# Altium footprint library BRT_Components.PcbLib: 132 footprints (part 1 of 9)
Each footprint in its own frame and in the unit in brackets; x right, y up, seen from the top. Pads: shape width x height; smd on the part's side, far side on the other; paste and mask are expansions set on the pad; w line width, h text height; cw(c..) or ccw(c..) is an arc to the next point about the centre after c.
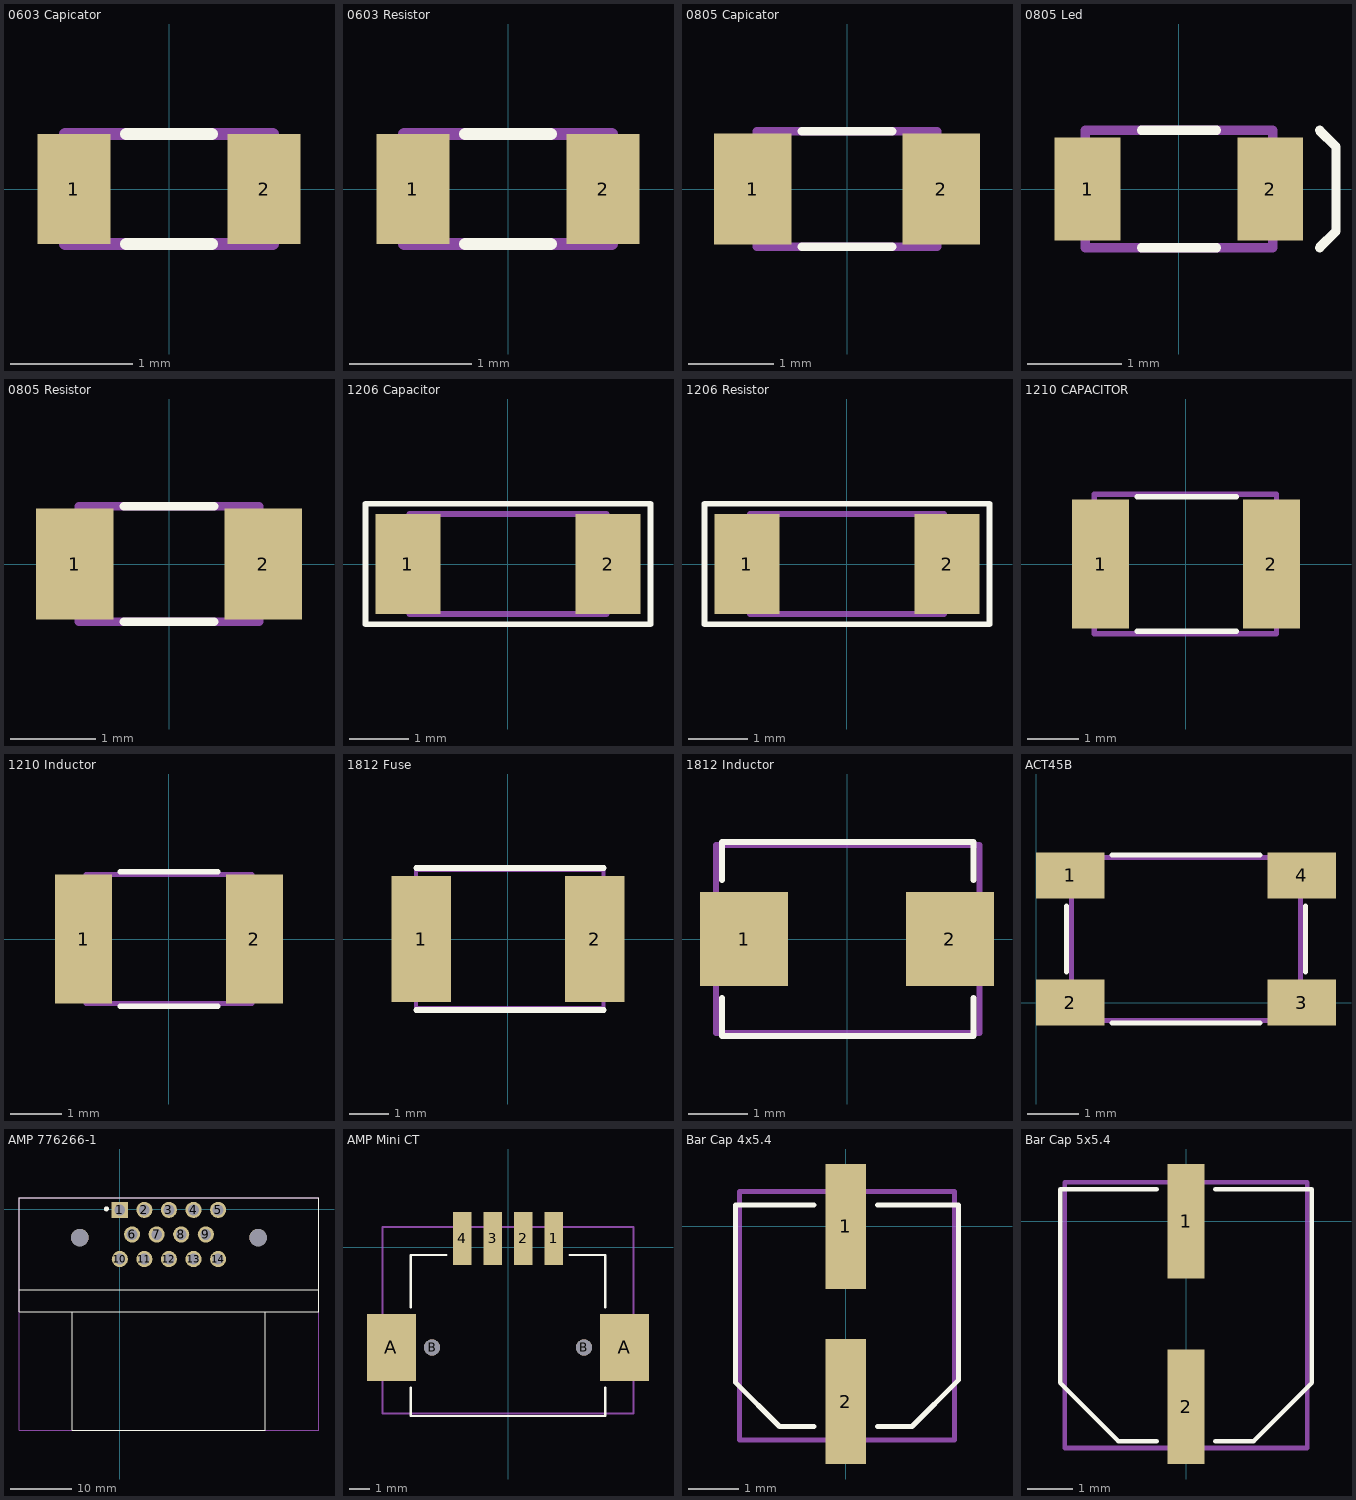
[diagram p0: the footprints below, top view; thin cyan lines are the x and y axes]

## 0603 Capicator [mm]
pads (2):
  rect 0.6x0.9 smd: 1(-0.78,0) 2(0.78,0)
Top Overlay:
  lines w0.1: -0.35,-0.45 0.35,-0.45 ; -0.35,0.45 0.35,0.45
Mechanical 13:
  lines w0.1: -0.85,-0.45 -0.85,0.45 0.85,0.45 0.85,-0.45 -0.85,-0.45
3D body "CAPC-0603-T0.9-BN.stp": height 0.9, standoff 0, extent -0.825,-0.45 0.875,0.45

## 0603 Resistor [mm]
pads (2):
  rect 0.6x0.9 smd: 1(-0.78,0) 2(0.78,0)
Top Overlay:
  lines w0.1: -0.35,-0.45 0.35,-0.45 ; -0.35,0.45 0.35,0.45
Mechanical 13:
  lines w0.1: -0.85,-0.45 0.85,-0.45 0.85,0.45 -0.85,0.45 -0.85,-0.45
3D body "RESC-0603.stp": height 0.55, standoff 0, extent -0.85,-0.45 0.85,0.45

## 0805 Capicator [mm]
pads (2):
  rect 0.9x1.3 smd: 1(-1.1,0) 2(1.1,0)
Top Overlay:
  lines w0.1: -0.525,-0.675 0.525,-0.675 ; -0.525,0.675 0.525,0.675
Mechanical 13:
  lines w0.1: -1.05,-0.675 1.05,-0.675 1.05,0.675 -1.05,0.675 -1.05,-0.675
3D body "CAPC-0805-T0.75-BN.stp": height 0.75, standoff 0, extent -1.05,-0.675 1.05,0.675

## 0805 Led [mm]
pads (2):
  rect 0.7x1.1 smd: 1(-0.975,0) 2(0.975,0)
Top Overlay:
  lines w0.1: -0.4,-0.625 0.4,-0.625 ; -0.4,0.625 0.4,0.625 ; 1.5,-0.625 1.675,-0.45 1.675,0.45 1.5,0.625
Mechanical 13:
  lines w0.1: -1,-0.625 -1,0.625 1,0.625 1,-0.625 -1,-0.625
3D body "LED0805.step": height 1.1, standoff 0, extent -1.01,-0.625 1.01,0.625

## 0805 Resistor [mm]
pads (2):
  rect 0.9x1.3 smd: 1(-1.1,0) 2(1.1,0)
Top Overlay:
  lines w0.1: -0.525,-0.675 0.525,-0.675 ; -0.525,0.675 0.525,0.675
Mechanical 13:
  lines w0.1: -1.05,-0.675 1.05,-0.675 1.05,0.675 -1.05,0.675 -1.05,-0.675
3D body "RESC-0805.stp": height 0.6, standoff 0, extent -1.05,-0.675 1.05,0.675

## 1206 Capacitor [mm]
pads (2):
  rect 1.1x1.7 smd: 1(-1.7,0) 2(1.7,0)
Top Overlay:
  lines w0.1: -2.425,-1.025 -2.425,0.175 -2.425,1.025 2.425,1.025 2.425,-1.025 -2.425,-1.025
Mechanical 13:
  lines w0.1: -1.675,-0.85 1.675,-0.85 1.675,0.85 -1.675,0.85 -1.675,-0.85
3D body "CAPC-1206-T1.0-BN.stp": height 1, standoff 0, extent -1.675,-0.875 1.675,0.875

## 1206 Resistor [mm]
pads (2):
  rect 1.1x1.7 smd: 1(-1.7,0) 2(1.7,0)
Top Overlay:
  lines w0.1: -2.425,-1.025 -2.425,0.175 -2.425,1.025 2.425,1.025 2.425,-1.025 -2.425,-1.025
Mechanical 13:
  lines w0.1: -1.65,-0.85 1.65,-0.85 1.65,0.85 -1.65,0.85 -1.65,-0.85
3D body "RESC-1206.stp": height 0.65, standoff 0, extent -1.65,-0.85 1.65,0.85

## 1210 CAPACITOR [mm]
pads (2):
  rect 1.1x2.5 smd: 1(-1.65,0) 2(1.65,0)
Top Overlay:
  lines w0.1: -0.95,-1.3 0.975,-1.3 ; -0.95,1.3 0.975,1.3
Mechanical 13:
  lines w0.1: -1.775,-1.35 1.75,-1.35 1.75,1.35 -1.775,1.35 -1.775,-1.35
3D body "CAPC-1210-T1.8-BN.stp": height 1.8, standoff 0, extent -1.75,-1.35 1.75,1.35

## 1210 Inductor [mm]
pads (2):
  rect 1.1x2.5 smd: 1(-1.65,0) 2(1.65,0)
Top Overlay:
  lines w0.1: -0.95,-1.3 0.95,-1.3 ; -0.95,1.3 0.95,1.3
Mechanical 13:
  lines w0.1: -1.602,-1.25 -1.602,1.25 1.602,1.25 1.602,-1.25 -1.602,-1.25
3D body "User Library-NLV32.step": height 2.28, standoff 0, extent -1.602,-1.25 1.602,1.25

## 1812 Fuse [mm]
height 1.1
pads (2):
  rect 1.5x3.2 smd: 1(-2.2,0) 2(2.2,0)
Top Overlay:
  lines w0.15: -2.325,-1.8 2.425,-1.8 ; -2.325,1.8 2.425,1.8
Mechanical 13:
  lines w0.1: -2.325,-1.75 2.425,-1.75 2.425,1.75 -2.325,1.75 -2.325,-1.75
3D body "User Library-Fuse 1812.step": height 1.03, standoff 0, extent -2.32,-1.745 2.415,1.735

## 1812 Inductor [mm]
pads (2):
  rect 1.5x1.6 smd: 1(-1.75,0) 2(1.75,0)
Top Overlay:
  lines w0.1: -2.125,-1 -2.125,-1.65 1.95,-1.65 2.15,-1.65 2.15,-1 ; -2.125,1 -2.125,1.65 2.15,1.65 2.15,1
Mechanical 13:
  lines w0.1: -2.225,-1.6 -2.225,1.6 2.25,1.6 2.25,-1.6 -2.225,-1.6
3D body "cm453232.stp": height 3.3, standoff 0.1, extent -2.25,-1.6 2.25,1.6

## ACT45B [mm]
pads (4):
  rect 1.35x0.9 smd: 1(0.675,2.5) 2(0.675,0) 3(5.225,0) 4(5.225,2.5)
Top Overlay:
  lines w0.1: 0.6,0.6 0.6,1.9 ; 1.5,-0.4 4.4,-0.4 ; 1.5,2.9 4.4,2.9 ; 5.3,0.6 5.3,1.9
Mechanical 13:
  lines w0.1: 0.7,-0.35 5.2,-0.35 5.2,2.85 0.7,2.85 0.7,-0.35
3D body "ACT45B_GERMANY.STEP": height 3, standoff 0, extent 0.7,-0.35 5.2,2.85

## AMP 776266-1 [mm]
pads (16):
  rect 2.625x2.625 hole 1.75: 1(-0.019,-0.061)
  round 2.625 hole 1.75: 2(3.981,-0.061) 3(7.981,-0.061) 4(11.981,-0.061) 5(15.981,-0.061) 6(1.981,-4.061) 7(5.981,-4.061) 8(9.981,-4.061) 9(13.981,-4.061) 10(-0.019,-8.061) 11(3.981,-8.061) 12(7.981,-8.061) 13(11.981,-8.061) 14(15.981,-8.061)
  round 2.85 hole 2.85 unplated: None(-6.519,-4.561) None(22.481,-4.561)
Top Overlay:
  circle w0.4: c-2.2,0.1 r0.2
  lines w0.1: -16.419,-13.061 32.381,-13.061 ; -16.419,-13.061 -16.419,1.9 32.381,1.9 32.381,-13.061 ; -16.419,-13.061 -16.419,-16.611 -7.719,-16.611 ; -7.719,-16.611 23.681,-16.611 ; -7.719,-16.611 -7.719,-35.911 23.681,-35.911 23.681,-16.611 ; 23.681,-16.611 32.381,-16.611 32.381,-13.061
Mechanical 13:
  lines w0.1: -16.4,-35.9 -16.4,1.9 32.4,1.9 32.4,-35.9 -16.4,-35.9
3D body "AMP 776266-1.stp": height 29.05, standoff -3.05, extent -16.4,-35.9 32.4,1.9

## AMP Mini CT [mm]
pads (8):
  rect 0.914x2.6 smd: 1(2.25,0.433) 2(0.75,0.433) 3(-0.75,0.433) 4(-2.25,0.433)
  rect 2.413x3.302 smd: A(-5.753,-4.945) A(5.753,-4.945)
  round 0.8 hole 0.8: B(-3.75,-4.945) B(3.75,-4.945)
Top Overlay:
  lines w0.1: -4.8,-6.929 -4.8,-8.323 4.8,-8.323 4.8,-6.929 ; -4.8,-2.961 -4.8,-0.373 -3.04,-0.373 ; 3.04,-0.373 4.8,-0.373 4.8,-2.961
Mechanical 13:
  lines w0.1: -6.2,-8.2 6.2,-8.2 6.2,1 -6.2,1 -6.2,-8.2
3D body "c-292227-4-a1-3d.stp": height 4.95, standoff -0.75, extent -6.2,-8.2 6.2,1

## Bar Cap 4x5.4 [mm]
pads (2):
  rect 0.8x2.5 smd: 1(0,0) 2(0,-3.5)
Top Overlay:
  lines w0.1: -0.635,-4 -1.325,-4 -2.2,-3.125 -2.2,0.425 -0.635,0.425 ; 0.635,-4 1.325,-4 2.25,-3.075 2.25,0.425 0.635,0.425
Mechanical 13:
  lines w0.1: -2.125,-4.275 2.175,-4.275 2.175,0.7 -2.125,0.7 -2.125,-4.275
3D body "User Library-CAP SMD SVP 4_0x5_4.STEP": height 5.4, standoff 0, extent -2.15,-4.3 2.15,0.7

## Bar Cap 5x5.4 [mm]
pads (2):
  rect 0.8x2.5 smd: 1(0,0) 2(0,-4.05)
Top Overlay:
  lines w0.1: -0.635,0.7 -2.75,0.7 -2.75,-3.525 -1.475,-4.8 -0.635,-4.8 ; 0.635,0.7 2.75,0.7 2.75,-3.525 1.475,-4.8 0.635,-4.8 ; -0.635,-4.801 -0.635,-4.8 ; 0.635,-4.801 0.635,-4.8
Mechanical 13:
  lines w0.1: -2.65,-4.95 -2.65,0.85 2.65,0.85 2.65,-4.95 -2.65,-4.95
3D body "User Library-E-cap_C.step": height 5.8, standoff 0, extent -2.65,-4.95 2.65,0.85